# Altium footprint library 430 integreted.PcbLib: 281 footprints (part 18 of 18)
Each footprint in its own frame and in the unit in brackets; x right, y up, seen from the top. Pads: shape width x height; smd on the part's side, far side on the other; paste and mask are expansions set on the pad; w line width, h text height; cw(c..) or ccw(c..) is an arc to the next point about the centre after c.
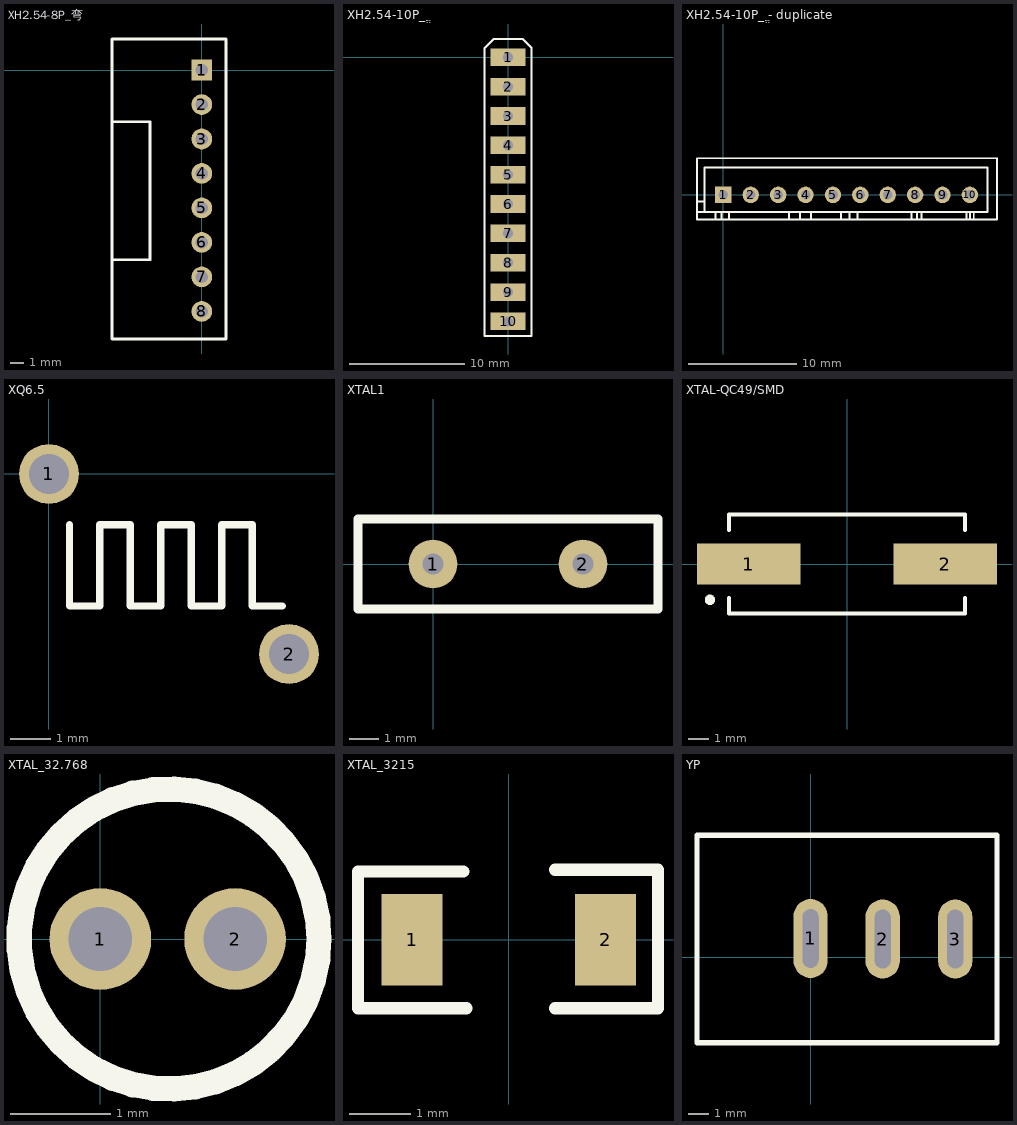
[diagram p17: the footprints below, top view; thin cyan lines are the x and y axes]

## XH2.54-8P_弯 [mil]
pads (8):
  rect 60x60 hole 35: 1(0,0)
  round 60 hole 35: 2(0,-100) 3(0,-200) 4(0,-300) 5(0,-400) 6(0,-500) 7(0,-600) 8(0,-700)
Top Overlay:
  lines w8: -260,-550 -150,-550 -150,-150 -260,-150 ; -260,-780 -260,90 70,90 70,-135 70,-565 70,-780 -150,-780 -260,-780

## XH2.54-10P_ֱ [mil]
pads (10):
  rect 120x60 hole 35: 1(0,0) 2(0,-100) 3(0,-200) 4(0,-300) 5(0,-400) 6(0,-500) 7(0,-600) 8(0,-700) 9(0,-800) 10(0,-900)
Top Overlay:
  lines w7: -80,31 -80,-950 80,-950 80,33
  lines w8: -80,31 -48.5,62.5 50.5,62.5 72.62,40.38 80,33

## XH2.54-10P_ֱ - duplicate [mil]
pads (10):
  rect 60x60 hole 35: 1(0,0)
  round 60 hole 35: 2(100,0) 3(200,0) 4(300,0) 5(400,0) 6(500,0) 7(600,0) 8(700,0) 9(800,0) 10(900,0)
Top Overlay:
  lines w7: -96.46,-62.99 -68.9,-62.99 ; -96.46,-23.62 -68.9,-23.62 ; -96.46,133.86 -96.46,-90.55 968,-90.55 ; -96.06,133.86 964,133.86 ; -29.53,-90.55 -29.53,-62.99 ; -7.48,-90.16 -7.48,-62.99 ; 20,-87.56 20,-62.99 ; 240,-90 240,-62.99 ; 280,-90 280,-62.44 ; 430,-90.55 430,-62.99 ; 460,-90.55 460,-62.99 ; 490,-90.55 490,-62.99 ; 964,-62.99 296.46,-62.99 268.9,-62.99 -68.9,-62.99 ; 964,100 353.03,100 -68.9,100 -68.9,-62.99 ; 320,-90 320,-62.44 320,-90
  lines w7.01: 687,-88 687,-64 ; 706,-90.55 707,-89.55 707,-63 ; 724,-87 724,-63 ; 888,-89.55 888,-63 ; 900,-90.55 900,-64 ; 914,-64 914,-90 915,-91 ; 960,133.86 998.14,133.86 999,133 999,-90.55 968,-90.55 ; 964,-62.99 964,100

## XQ6.5 [mm]
pads (2):
  round 1.5 hole 1: 1(0,0) 2(6,-4.5)
Top Overlay:
  lines w0.178: 0.508,-1.27 0.508,-3.302 1.27,-3.302 1.27,-1.27 2.032,-1.27 2.032,-3.302 2.794,-3.302 2.794,-1.27 3.556,-1.27 3.556,-1.524 3.556,-2.54 3.556,-3.302 4.318,-3.302 4.318,-1.27 5.08,-1.27 5.08,-3.302 5.842,-3.302

## XTAL1 [mil]
pads (2):
  round 65 hole 28: 1(0,0) 2(200,0)
Top Overlay:
  lines w12: -100,-60 -100,60 300,60 300,-60 -100,-60

## XTAL-QC49/SMD [mm]
pads (2):
  rect 5x2 smd: 1(-4.75,0) 2(4.75,0)
Top Overlay:
  circle w0.25: c-6.625,-1.73 r0.125
  lines w0.2: -5.7,-1.65 -5.7,-2.4 5.7,-2.4 5.7,-1.65 ; -5.7,1.65 -5.7,2.4 5.7,2.4 5.7,1.65
3D body: height 4, standoff 0, extent -6.7,-2.462 6.7,2.439

## XTAL_32.768 [mil]
pads (2):
  round 40 hole 25: 1(0,0) 2(53,0)
Top Overlay:
  circle w10: c27,0 r59
3D body: height 354.33, standoff -118.11, extent -32.87,-59.06 85.24,59.06

## XTAL_3215 [mm]
pads (2):
  rect 1x1.5 smd: 1(-1.581,0) 2(1.581,0)
Top Overlay:
  lines w0.2: -0.743,1.118 -2.464,1.118 -2.464,-1.118 -0.692,-1.118 ; 0.756,-1.118 2.438,-1.118 2.438,1.143 0.756,1.143
3D body: height 0.81, standoff 0, extent -1.593,-0.75 1.607,0.75

## YP [mil]
pads (3):
  oval 65x150 hole 30 slot 112 at 90 deg: 1(0,36) 2(137,35) 3(275,35)
Top Overlay:
  lines w10: -216,-162 354.33,-162 354.33,232 -216,232 -216,-162